# Altium schematic symbol library 6-Connectors 连接器.端子.SchLib: 402 symbols (part 5 of 5)
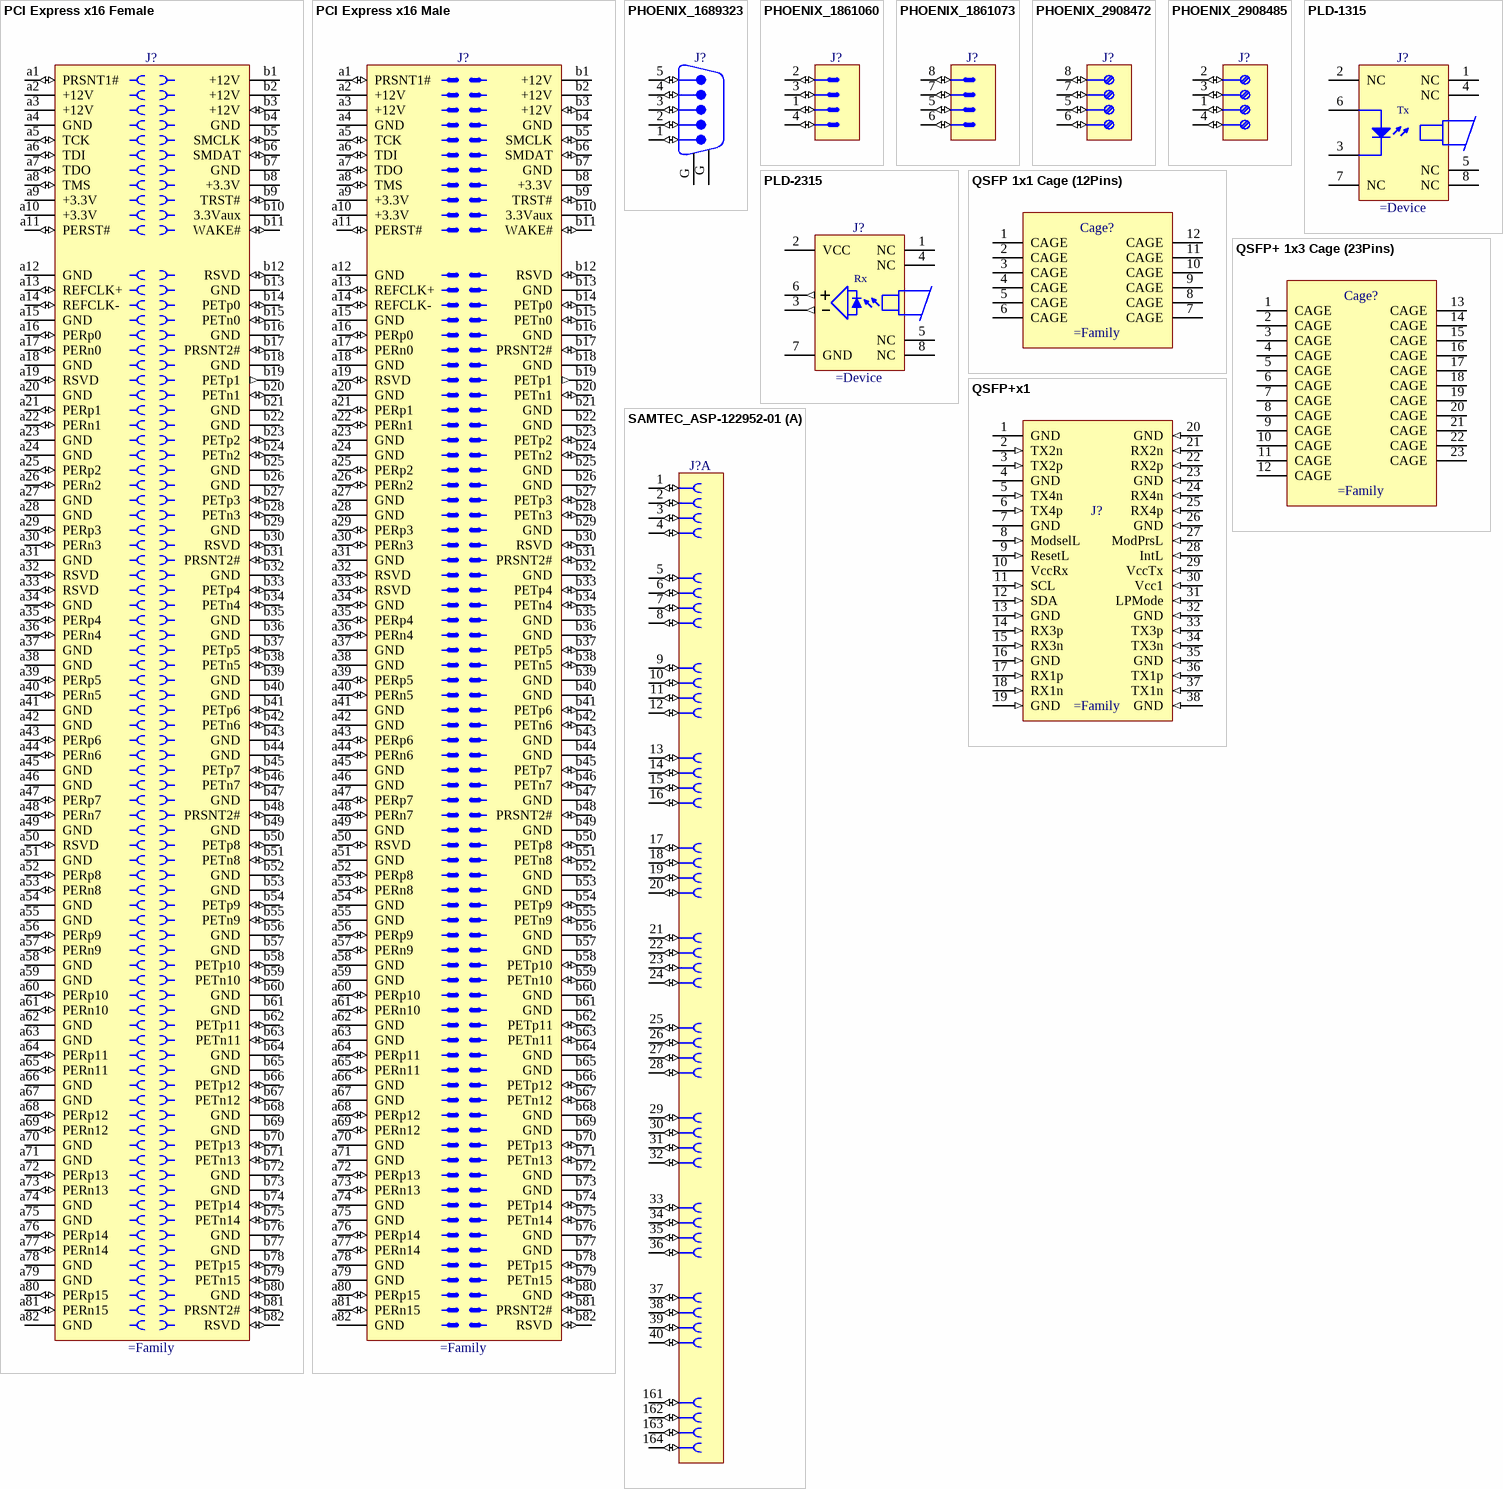
[diagram p53: symbols PCI Express x16 Female to SAMTEC_ASP-122952-01]

## PCI Express x16 Female
designator J?
164 contacts Board Eddge PCI Express x16 Connector
pins: a1 PRSNT1# (io), a2 +12V (power), a3 +12V (power), a4 GND (power), a5 TCK (io), a6 TDI (io), a7 TDO (io), a8 TMS (io), a9 +3.3V (power), a10 +3.3V (power), a11 PERST# (io), a12 GND (power), a13 REFCLK+ (io), a14 REFCLK- (io), a15 GND (power), a16 PERp0 (io), a17 PERn0 (io), a18 GND (power), a19 RSVD (io), a20 GND (power), a21 PERp1 (io), a22 PERn1 (io), a23 GND (power), a24 GND (power), a25 PERp2 (io), a26 PERn2 (io), a27 GND (power), a28 GND (power), a29 PERp3 (io), a30 PERn3 (io), a31 GND (power), a32 RSVD (io), a33 RSVD (io), a34 GND (io), a35 PERp4 (io), a36 PERn4 (io), a37 GND (power), a38 GND (power), a39 PERp5 (io), a40 PERn5 (io), a41 GND (power), a42 GND (power), a43 PERp6 (io), a44 PERn6 (io), a45 GND (power), a46 GND (power), a47 PERp7 (io), a48 PERn7 (io), a49 GND (power), a50 RSVD (io), a51 GND (power), a52 PERp8 (io), a53 PERn8 (io), a54 GND (power), a55 GND (power), a56 PERp9 (io), a57 PERn9 (io), a58 GND (power), a59 GND (power), a60 PERp10 (io), a61 PERn10 (io), a62 GND (power), a63 GND (power), a64 PERp11 (io), a65 PERn11 (io), a66 GND (power), a67 GND (power), a68 PERp12 (io), a69 PERn12 (io), a70 GND (power), a71 GND (power), a72 PERp13 (io), a73 PERn13 (io), a74 GND (power), a75 GND (power), a76 PERp14 (io), a77 PERn14 (io), a78 GND (power), a79 GND (power), a80 PERp15 (io), a81 PERn15 (io), a82 GND (power), b1 +12V (power), b2 +12V (power), b3 +12V (io), b4 GND (power), b5 SMCLK (io), b6 SMDAT (io), b7 GND (power), b8 +3.3V (power), b9 TRST# (io), b10 3.3Vaux (power), b11 WAKE# (io), b12 RSVD (io), b13 GND (power), b14 PETp0 (io), b15 PETn0 (io), b16 GND (power), b17 PRSNT2# (io), b18 GND (power), b19 PETp1 (out), b20 PETn1 (io), b21 GND (power), b22 GND (power), b23 PETp2 (io), b24 PETn2 (io), b25 GND (power), b26 GND (power), b27 PETp3 (io), b28 PETn3 (io), b29 GND (power), b30 RSVD (io), b31 PRSNT2# (io), b32 GND (power), b33 PETp4 (io), b34 PETn4 (io), b35 GND (power), b36 GND (power), b37 PETp5 (io), b38 PETn5 (io), b39 GND (power), b40 GND (power), b41 PETp6 (io), b42 PETn6 (io), b43 GND (power), b44 GND (power), b45 PETp7 (io), b46 PETn7 (io), b47 GND (power), b48 PRSNT2# (io), b49 GND (power), b50 PETp8 (io), b51 PETn8 (io), b52 GND (power), b53 GND (power), b54 PETp9 (io), b55 PETn9 (io), b56 GND (power), b57 GND (power), b58 PETp10 (io), b59 PETn10 (io), b60 GND (power), b61 GND (power), b62 PETp11 (io), b63 PETn11 (io), b64 GND (power), b65 GND (power), b66 PETp12 (io), b67 PETn12 (io), b68 GND (power), b69 GND (power), b70 PETp13 (io), b71 PETn13 (io), b72 GND (power), b73 GND (power), b74 PETp14 (io), b75 PETn14 (io), b76 GND (power), b77 GND (power), b78 PETp15 (io), b79 PETn15 (io), b80 GND (io), b81 PRSNT2# (io), b82 RSVD (io)

## PCI Express x16 Male
designator J?
164 contacts Board Eddge PCI Express x16 Connector
pins: a1 PRSNT1# (io), a2 +12V (power), a3 +12V (power), a4 GND (power), a5 TCK (io), a6 TDI (io), a7 TDO (io), a8 TMS (io), a9 +3.3V (power), a10 +3.3V (power), a11 PERST# (io), a12 GND (power), a13 REFCLK+ (io), a14 REFCLK- (io), a15 GND (power), a16 PERp0 (io), a17 PERn0 (io), a18 GND (power), a19 RSVD (io), a20 GND (power), a21 PERp1 (io), a22 PERn1 (io), a23 GND (power), a24 GND (power), a25 PERp2 (io), a26 PERn2 (io), a27 GND (power), a28 GND (power), a29 PERp3 (io), a30 PERn3 (io), a31 GND (power), a32 RSVD (io), a33 RSVD (io), a34 GND (io), a35 PERp4 (io), a36 PERn4 (io), a37 GND (power), a38 GND (power), a39 PERp5 (io), a40 PERn5 (io), a41 GND (power), a42 GND (power), a43 PERp6 (io), a44 PERn6 (io), a45 GND (power), a46 GND (power), a47 PERp7 (io), a48 PERn7 (io), a49 GND (power), a50 RSVD (io), a51 GND (power), a52 PERp8 (io), a53 PERn8 (io), a54 GND (power), a55 GND (power), a56 PERp9 (io), a57 PERn9 (io), a58 GND (power), a59 GND (power), a60 PERp10 (io), a61 PERn10 (io), a62 GND (power), a63 GND (power), a64 PERp11 (io), a65 PERn11 (io), a66 GND (power), a67 GND (power), a68 PERp12 (io), a69 PERn12 (io), a70 GND (power), a71 GND (power), a72 PERp13 (io), a73 PERn13 (io), a74 GND (power), a75 GND (power), a76 PERp14 (io), a77 PERn14 (io), a78 GND (power), a79 GND (power), a80 PERp15 (io), a81 PERn15 (io), a82 GND (power), b1 +12V (power), b2 +12V (power), b3 +12V (io), b4 GND (power), b5 SMCLK (io), b6 SMDAT (io), b7 GND (power), b8 +3.3V (power), b9 TRST# (io), b10 3.3Vaux (power), b11 WAKE# (io), b12 RSVD (io), b13 GND (power), b14 PETp0 (io), b15 PETn0 (io), b16 GND (power), b17 PRSNT2# (io), b18 GND (power), b19 PETp1 (out), b20 PETn1 (io), b21 GND (power), b22 GND (power), b23 PETp2 (io), b24 PETn2 (io), b25 GND (power), b26 GND (power), b27 PETp3 (io), b28 PETn3 (io), b29 GND (power), b30 RSVD (io), b31 PRSNT2# (io), b32 GND (power), b33 PETp4 (io), b34 PETn4 (io), b35 GND (power), b36 GND (power), b37 PETp5 (io), b38 PETn5 (io), b39 GND (power), b40 GND (power), b41 PETp6 (io), b42 PETn6 (io), b43 GND (power), b44 GND (power), b45 PETp7 (io), b46 PETn7 (io), b47 GND (power), b48 PRSNT2# (io), b49 GND (power), b50 PETp8 (io), b51 PETn8 (io), b52 GND (power), b53 GND (power), b54 PETp9 (io), b55 PETn9 (io), b56 GND (power), b57 GND (power), b58 PETp10 (io), b59 PETn10 (io), b60 GND (power), b61 GND (power), b62 PETp11 (io), b63 PETn11 (io), b64 GND (power), b65 GND (power), b66 PETp12 (io), b67 PETn12 (io), b68 GND (power), b69 GND (power), b70 PETp13 (io), b71 PETn13 (io), b72 GND (power), b73 GND (power), b74 PETp14 (io), b75 PETn14 (io), b76 GND (power), b77 GND (power), b78 PETp15 (io), b79 PETn15 (io), b80 GND (io), b81 PRSNT2# (io), b82 RSVD (io)

## PHOENIX_1689323
designator J?
5-Positions POWER-SUBCON Shielded Header, With Capacitive  Ground Connection
pins: 1 (io), 2 (io), 3 (io), 4 (io), 5 (io), G, G

## PHOENIX_1861060
designator J?
COMBICON PCB Male Header, 4 Positions, Left
pins: 1 (io), 2 (io), 3 (io), 4 (io)
1 alternate drawing of the same symbol

## PHOENIX_1861073
designator J?
COMBICON PCB Male Header, 4 Positions, Right
pins: 5 (io), 6 (io), 7 (io), 8 (io)

## PHOENIX_2908472
designator J?
Terminal Block, 4 Positions, 5 to 8 With Screw Connection
pins: 5 (io), 6 (io), 7 (io), 8 (io)

## PHOENIX_2908485
designator J?
Terminal Block, 4 Positions, 1 to 4 With Screw Connection
pins: 1 (io), 2 (io), 3 (io), 4 (io)

## PLD-1315
designator J?
1300nm Singlemode Fiber Optic Transmitter
pins: 1 NC, 2 NC, 3 C (power), 4 NC, 5 NC, 6 A (power), 7 NC, 8 NC
text: Tx

## PLD-2315
designator J?
150Mbps, 1310 nm Fiber Optic Receiver
pins: 1 NC, 2 VCC (power), 3 SIG- (out), 4 NC, 5 NC, 6 SIG+ (out), 7 GND (power), 8 NC
text: Rx

## QSFP 1x1 Cage (12Pins)
designator Cage?
QSFP 1x1 Cage (12Pins)
pins: 1 CAGE (power), 2 CAGE (power), 3 CAGE (power), 4 CAGE (power), 5 CAGE (power), 6 CAGE (power), 7 CAGE (power), 8 CAGE (power), 9 CAGE (power), 10 CAGE (power), 11 CAGE (power), 12 CAGE (power)

## QSFP+ 1x3 Cage (23Pins)
designator Cage?
QSFP+ 1x3 Cage (23Pins)
pins: 1 CAGE (power), 2 CAGE (power), 3 CAGE (power), 4 CAGE (power), 5 CAGE (power), 6 CAGE (power), 7 CAGE (power), 8 CAGE (power), 9 CAGE (power), 10 CAGE (power), 11 CAGE (power), 12 CAGE (power), 13 CAGE (power), 14 CAGE (power), 15 CAGE (power), 16 CAGE (power), 17 CAGE (power), 18 CAGE (power), 19 CAGE (power), 20 CAGE (power), 21 CAGE (power), 22 CAGE (power), 23 CAGE (power)

## QSFP+x1
designator J?
38Position QSFP Connector  (Quad Small Form-factor Pluggable)
pins: 1 GND (power), 2 TX2n (in), 3 TX2p (in), 4 GND (power), 5 TX4n (in), 6 TX4p (in), 7 GND (power), 8 ModselL (in), 9 ResetL (in), 10 VccRx (power), 11 SCL (in), 12 SDA (in), 13 GND (in), 14 RX3p (in), 15 RX3n (in), 16 GND (in), 17 RX1p (in), 18 RX1n (in), 19 GND (in), 20 GND (in), 21 RX2n (in), 22 RX2p (in), 23 GND (in), 24 RX4n (in), 25 RX4p (in), 26 GND (in), 27 ModPrsL (in), 28 IntL (in), 29 VccTx (in), 30 Vcc1 (in), 31 LPMode (in), 32 GND (in), 33 TX3p (in), 34 TX3n (in), 35 GND (in), 36 TX1p (in), 37 TX1n (in), 38 GND (in)

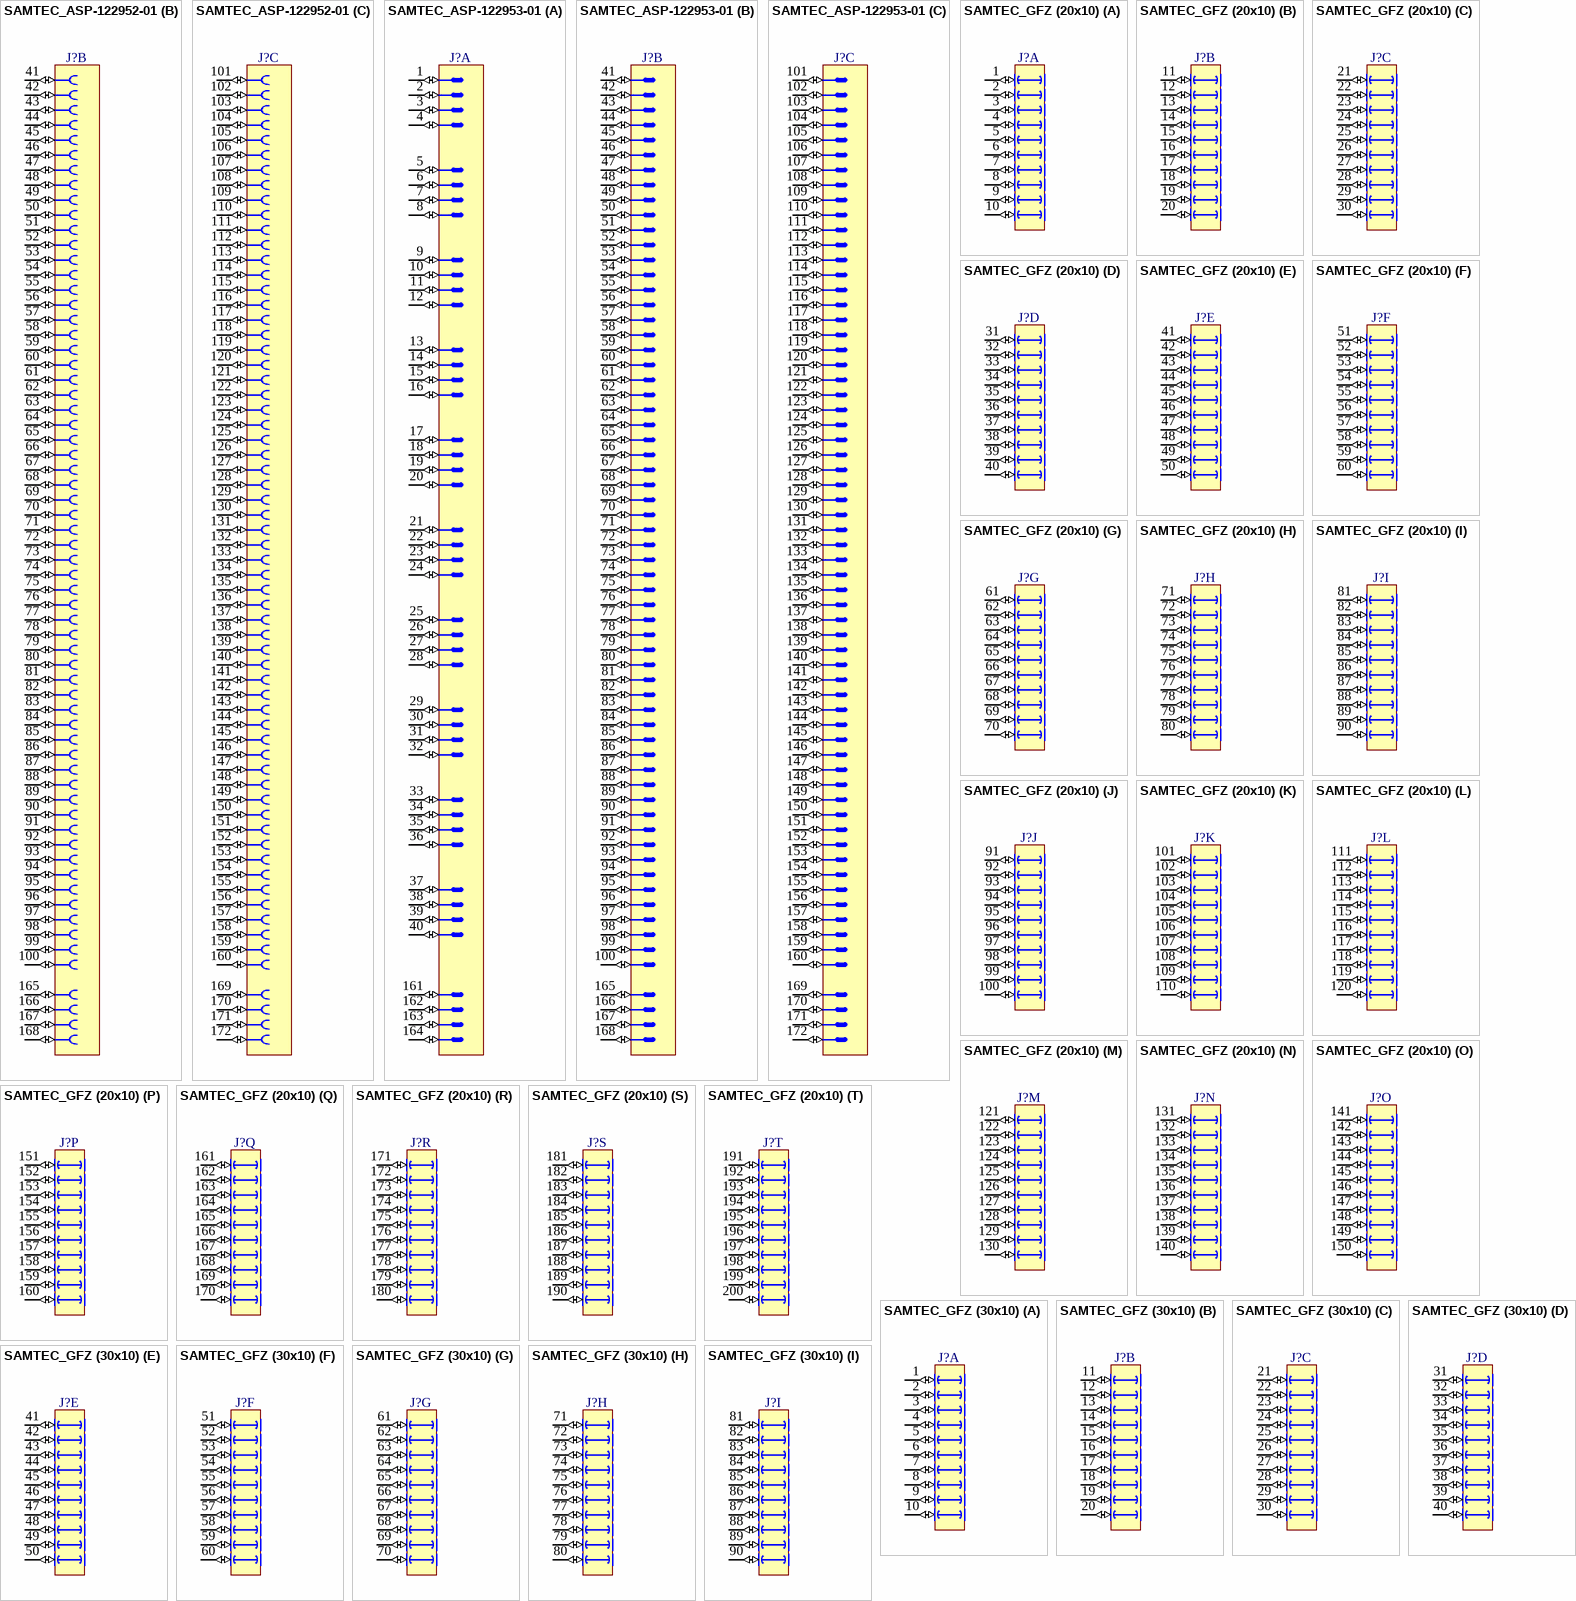
[diagram p43: symbols SAMTEC_ASP-122952-01 to SAMTEC_GFZ (30x10)]

## SAMTEC_ASP-122952-01
designator J?
Connector 160 Female 1x40 + 2x60 + 3x4 GND
part A pins: 1 (io), 2 (io), 3 (io), 4 (io), 5 (io), 6 (io), 7 (io), 8 (io), 9 (io), 10 (io), 11 (io), 12 (io), 13 (io), 14 (io), 15 (io), 16 (io), 17 (io), 18 (io), 19 (io), 20 (io), 21 (io), 22 (io), 23 (io), 24 (io), 25 (io), 26 (io), 27 (io), 28 (io), 29 (io), 30 (io), 31 (io), 32 (io), 33 (io), 34 (io), 35 (io), 36 (io), 37 (io), 38 (io), 39 (io), 40 (io), 161 (io), 162 (io), 163 (io), 164 (io)
part B pins: 41 (io), 42 (io), 43 (io), 44 (io), 45 (io), 46 (io), 47 (io), 48 (io), 49 (io), 50 (io), 51 (io), 52 (io), 53 (io), 54 (io), 55 (io), 56 (io), 57 (io), 58 (io), 59 (io), 60 (io), 61 (io), 62 (io), 63 (io), 64 (io), 65 (io), 66 (io), 67 (io), 68 (io), 69 (io), 70 (io), 71 (io), 72 (io), 73 (io), 74 (io), 75 (io), 76 (io), 77 (io), 78 (io), 79 (io), 80 (io), 81 (io), 82 (io), 83 (io), 84 (io), 85 (io), 86 (io), 87 (io), 88 (io), 89 (io), 90 (io), 91 (io), 92 (io), 93 (io), 94 (io), 95 (io), 96 (io), 97 (io), 98 (io), 99 (io), 100 (io), 165 (io), 166 (io), 167 (io), 168 (io)
part C pins: 101 (io), 102 (io), 103 (io), 104 (io), 105 (io), 106 (io), 107 (io), 108 (io), 109 (io), 110 (io), 111 (io), 112 (io), 113 (io), 114 (io), 115 (io), 116 (io), 117 (io), 118 (io), 119 (io), 120 (io), 121 (io), 122 (io), 123 (io), 124 (io), 125 (io), 126 (io), 127 (io), 128 (io), 129 (io), 130 (io), 131 (io), 132 (io), 133 (io), 134 (io), 135 (io), 136 (io), 137 (io), 138 (io), 139 (io), 140 (io), 141 (io), 142 (io), 143 (io), 144 (io), 145 (io), 146 (io), 147 (io), 148 (io), 149 (io), 150 (io), 151 (io), 152 (io), 153 (io), 154 (io), 155 (io), 156 (io), 157 (io), 158 (io), 159 (io), 160 (io), 169 (io), 170 (io), 171 (io), 172 (io)

## SAMTEC_ASP-122953-01
designator J?
Connector 160 Male 1x40 + 2x60 + 3x4 GND
part A pins: 1 (io), 2 (io), 3 (io), 4 (io), 5 (io), 6 (io), 7 (io), 8 (io), 9 (io), 10 (io), 11 (io), 12 (io), 13 (io), 14 (io), 15 (io), 16 (io), 17 (io), 18 (io), 19 (io), 20 (io), 21 (io), 22 (io), 23 (io), 24 (io), 25 (io), 26 (io), 27 (io), 28 (io), 29 (io), 30 (io), 31 (io), 32 (io), 33 (io), 34 (io), 35 (io), 36 (io), 37 (io), 38 (io), 39 (io), 40 (io), 161 (io), 162 (io), 163 (io), 164 (io)
part B pins: 41 (io), 42 (io), 43 (io), 44 (io), 45 (io), 46 (io), 47 (io), 48 (io), 49 (io), 50 (io), 51 (io), 52 (io), 53 (io), 54 (io), 55 (io), 56 (io), 57 (io), 58 (io), 59 (io), 60 (io), 61 (io), 62 (io), 63 (io), 64 (io), 65 (io), 66 (io), 67 (io), 68 (io), 69 (io), 70 (io), 71 (io), 72 (io), 73 (io), 74 (io), 75 (io), 76 (io), 77 (io), 78 (io), 79 (io), 80 (io), 81 (io), 82 (io), 83 (io), 84 (io), 85 (io), 86 (io), 87 (io), 88 (io), 89 (io), 90 (io), 91 (io), 92 (io), 93 (io), 94 (io), 95 (io), 96 (io), 97 (io), 98 (io), 99 (io), 100 (io), 165 (io), 166 (io), 167 (io), 168 (io)
part C pins: 101 (io), 102 (io), 103 (io), 104 (io), 105 (io), 106 (io), 107 (io), 108 (io), 109 (io), 110 (io), 111 (io), 112 (io), 113 (io), 114 (io), 115 (io), 116 (io), 117 (io), 118 (io), 119 (io), 120 (io), 121 (io), 122 (io), 123 (io), 124 (io), 125 (io), 126 (io), 127 (io), 128 (io), 129 (io), 130 (io), 131 (io), 132 (io), 133 (io), 134 (io), 135 (io), 136 (io), 137 (io), 138 (io), 139 (io), 140 (io), 141 (io), 142 (io), 143 (io), 144 (io), 145 (io), 146 (io), 147 (io), 148 (io), 149 (io), 150 (io), 151 (io), 152 (io), 153 (io), 154 (io), 155 (io), 156 (io), 157 (io), 158 (io), 159 (io), 160 (io), 169 (io), 170 (io), 171 (io), 172 (io)

## SAMTEC_GFZ (20x10)
designator J?
Connector 200 (10X20)
part A pins: 1 (io), 2 (io), 3 (io), 4 (io), 5 (io), 6 (io), 7 (io), 8 (io), 9 (io), 10 (io)
part B pins: 11 (io), 12 (io), 13 (io), 14 (io), 15 (io), 16 (io), 17 (io), 18 (io), 19 (io), 20 (io)
part C pins: 21 (io), 22 (io), 23 (io), 24 (io), 25 (io), 26 (io), 27 (io), 28 (io), 29 (io), 30 (io)
part D pins: 31 (io), 32 (io), 33 (io), 34 (io), 35 (io), 36 (io), 37 (io), 38 (io), 39 (io), 40 (io)
part E pins: 41 (io), 42 (io), 43 (io), 44 (io), 45 (io), 46 (io), 47 (io), 48 (io), 49 (io), 50 (io)
part F pins: 51 (io), 52 (io), 53 (io), 54 (io), 55 (io), 56 (io), 57 (io), 58 (io), 59 (io), 60 (io)
part G pins: 61 (io), 62 (io), 63 (io), 64 (io), 65 (io), 66 (io), 67 (io), 68 (io), 69 (io), 70 (io)
part H pins: 71 (io), 72 (io), 73 (io), 74 (io), 75 (io), 76 (io), 77 (io), 78 (io), 79 (io), 80 (io)
part I pins: 81 (io), 82 (io), 83 (io), 84 (io), 85 (io), 86 (io), 87 (io), 88 (io), 89 (io), 90 (io)
part J pins: 91 (io), 92 (io), 93 (io), 94 (io), 95 (io), 96 (io), 97 (io), 98 (io), 99 (io), 100 (io)
part K pins: 101 (io), 102 (io), 103 (io), 104 (io), 105 (io), 106 (io), 107 (io), 108 (io), 109 (io), 110 (io)
part L pins: 111 (io), 112 (io), 113 (io), 114 (io), 115 (io), 116 (io), 117 (io), 118 (io), 119 (io), 120 (io)
part M pins: 121 (io), 122 (io), 123 (io), 124 (io), 125 (io), 126 (io), 127 (io), 128 (io), 129 (io), 130 (io)
part N pins: 131 (io), 132 (io), 133 (io), 134 (io), 135 (io), 136 (io), 137 (io), 138 (io), 139 (io), 140 (io)
part O pins: 141 (io), 142 (io), 143 (io), 144 (io), 145 (io), 146 (io), 147 (io), 148 (io), 149 (io), 150 (io)
part P pins: 151 (io), 152 (io), 153 (io), 154 (io), 155 (io), 156 (io), 157 (io), 158 (io), 159 (io), 160 (io)
part Q pins: 161 (io), 162 (io), 163 (io), 164 (io), 165 (io), 166 (io), 167 (io), 168 (io), 169 (io), 170 (io)
part R pins: 171 (io), 172 (io), 173 (io), 174 (io), 175 (io), 176 (io), 177 (io), 178 (io), 179 (io), 180 (io)
part S pins: 181 (io), 182 (io), 183 (io), 184 (io), 185 (io), 186 (io), 187 (io), 188 (io), 189 (io), 190 (io)
part T pins: 191 (io), 192 (io), 193 (io), 194 (io), 195 (io), 196 (io), 197 (io), 198 (io), 199 (io), 200 (io)
1 alternate drawing of the same symbol

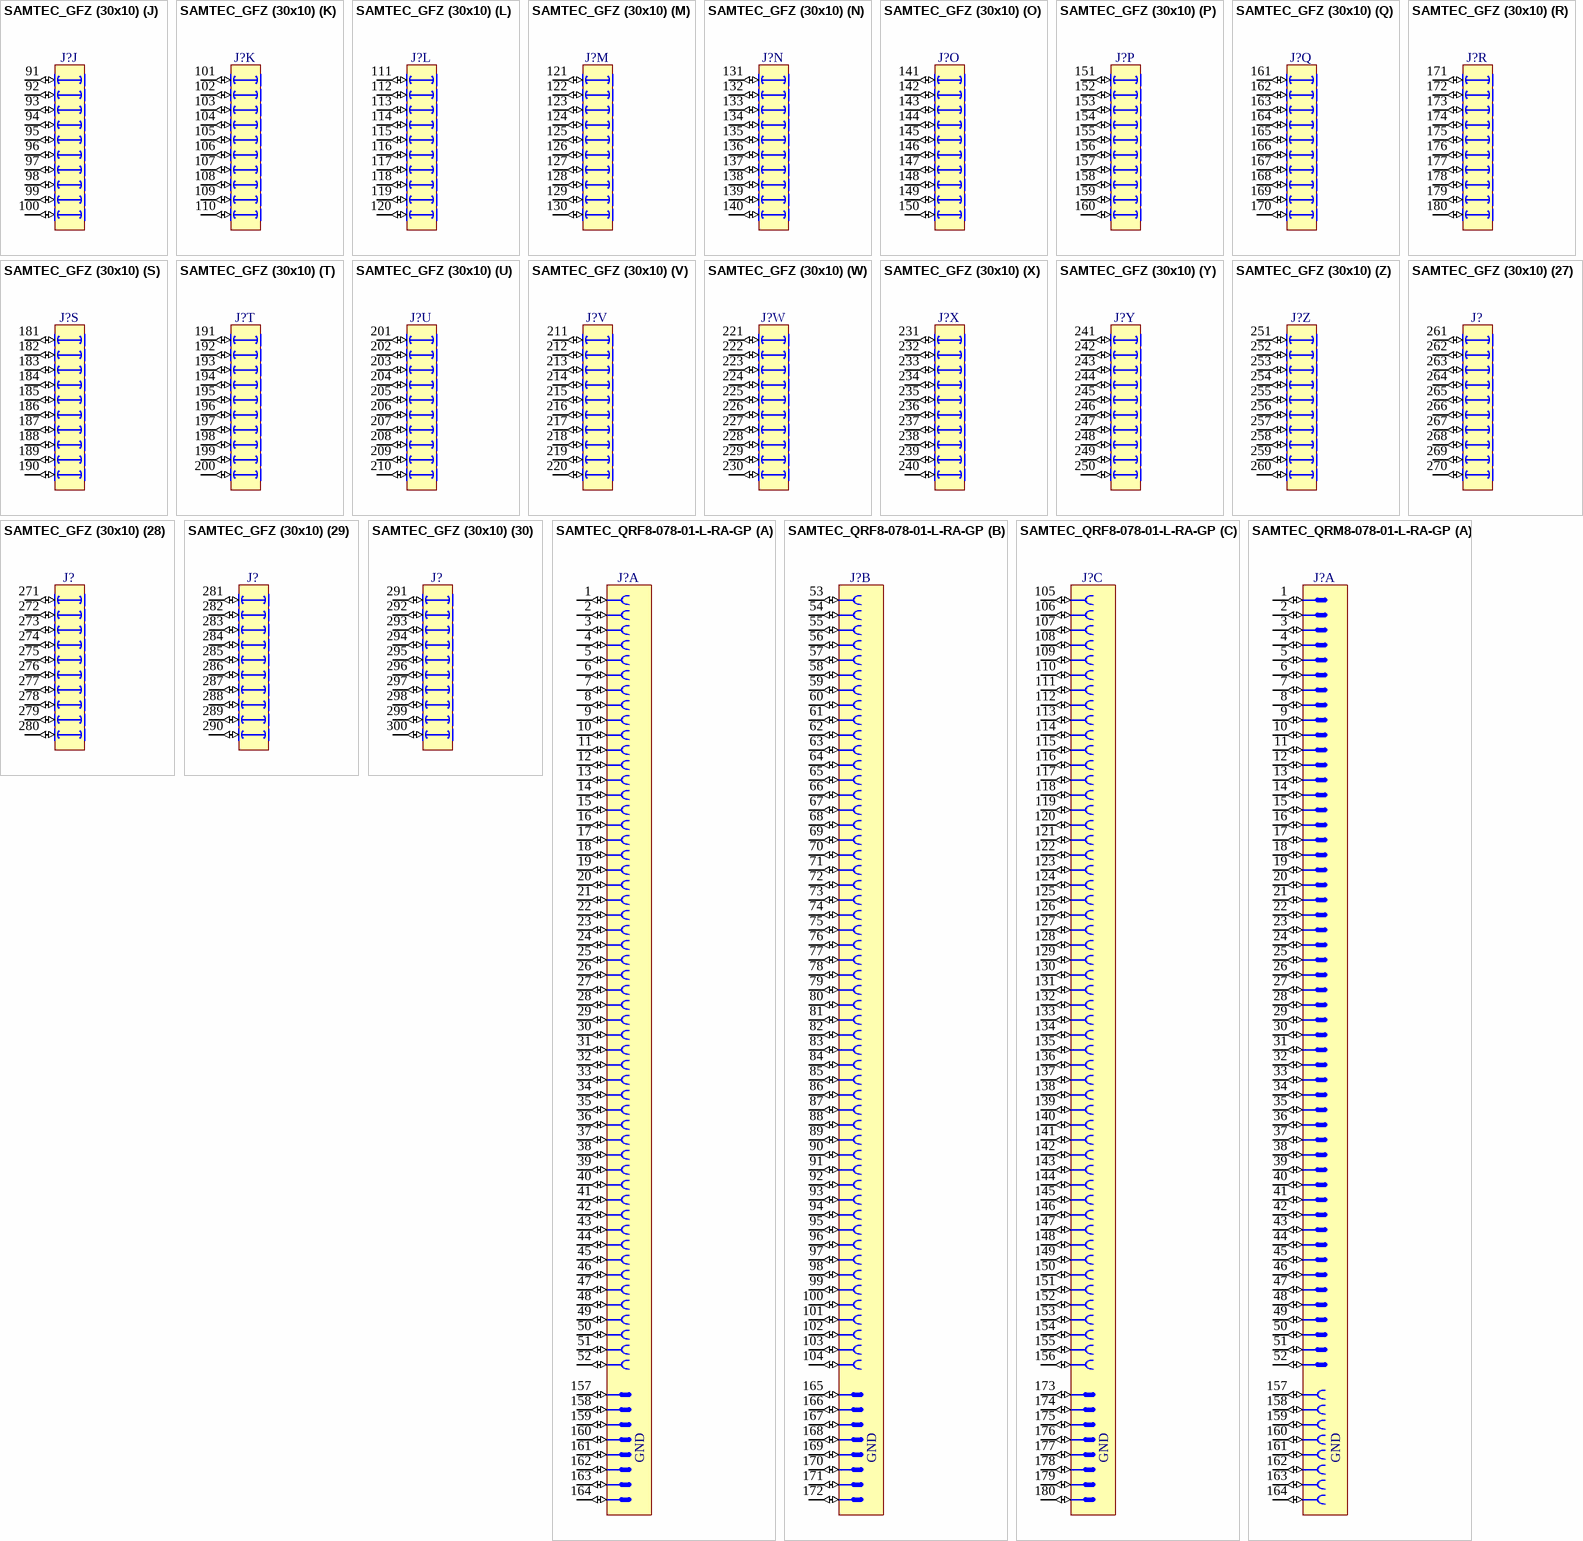
[diagram p44: symbols SAMTEC_GFZ (30x10) to SAMTEC_QRM8-078-01-L-RA-GP]

## SAMTEC_GFZ (30x10)
designator J?
Connector 300 (10X30)
part A pins: 1 (io), 2 (io), 3 (io), 4 (io), 5 (io), 6 (io), 7 (io), 8 (io), 9 (io), 10 (io)
part B pins: 11 (io), 12 (io), 13 (io), 14 (io), 15 (io), 16 (io), 17 (io), 18 (io), 19 (io), 20 (io)
part C pins: 21 (io), 22 (io), 23 (io), 24 (io), 25 (io), 26 (io), 27 (io), 28 (io), 29 (io), 30 (io)
part D pins: 31 (io), 32 (io), 33 (io), 34 (io), 35 (io), 36 (io), 37 (io), 38 (io), 39 (io), 40 (io)
part E pins: 41 (io), 42 (io), 43 (io), 44 (io), 45 (io), 46 (io), 47 (io), 48 (io), 49 (io), 50 (io)
part F pins: 51 (io), 52 (io), 53 (io), 54 (io), 55 (io), 56 (io), 57 (io), 58 (io), 59 (io), 60 (io)
part G pins: 61 (io), 62 (io), 63 (io), 64 (io), 65 (io), 66 (io), 67 (io), 68 (io), 69 (io), 70 (io)
part H pins: 71 (io), 72 (io), 73 (io), 74 (io), 75 (io), 76 (io), 77 (io), 78 (io), 79 (io), 80 (io)
part I pins: 81 (io), 82 (io), 83 (io), 84 (io), 85 (io), 86 (io), 87 (io), 88 (io), 89 (io), 90 (io)
part J pins: 91 (io), 92 (io), 93 (io), 94 (io), 95 (io), 96 (io), 97 (io), 98 (io), 99 (io), 100 (io)
part K pins: 101 (io), 102 (io), 103 (io), 104 (io), 105 (io), 106 (io), 107 (io), 108 (io), 109 (io), 110 (io)
part L pins: 111 (io), 112 (io), 113 (io), 114 (io), 115 (io), 116 (io), 117 (io), 118 (io), 119 (io), 120 (io)
part M pins: 121 (io), 122 (io), 123 (io), 124 (io), 125 (io), 126 (io), 127 (io), 128 (io), 129 (io), 130 (io)
part N pins: 131 (io), 132 (io), 133 (io), 134 (io), 135 (io), 136 (io), 137 (io), 138 (io), 139 (io), 140 (io)
part O pins: 141 (io), 142 (io), 143 (io), 144 (io), 145 (io), 146 (io), 147 (io), 148 (io), 149 (io), 150 (io)
part P pins: 151 (io), 152 (io), 153 (io), 154 (io), 155 (io), 156 (io), 157 (io), 158 (io), 159 (io), 160 (io)
part Q pins: 161 (io), 162 (io), 163 (io), 164 (io), 165 (io), 166 (io), 167 (io), 168 (io), 169 (io), 170 (io)
part R pins: 171 (io), 172 (io), 173 (io), 174 (io), 175 (io), 176 (io), 177 (io), 178 (io), 179 (io), 180 (io)
part S pins: 181 (io), 182 (io), 183 (io), 184 (io), 185 (io), 186 (io), 187 (io), 188 (io), 189 (io), 190 (io)
part T pins: 191 (io), 192 (io), 193 (io), 194 (io), 195 (io), 196 (io), 197 (io), 198 (io), 199 (io), 200 (io)
part U pins: 201 (io), 202 (io), 203 (io), 204 (io), 205 (io), 206 (io), 207 (io), 208 (io), 209 (io), 210 (io)
part V pins: 211 (io), 212 (io), 213 (io), 214 (io), 215 (io), 216 (io), 217 (io), 218 (io), 219 (io), 220 (io)
part W pins: 221 (io), 222 (io), 223 (io), 224 (io), 225 (io), 226 (io), 227 (io), 228 (io), 229 (io), 230 (io)
part X pins: 231 (io), 232 (io), 233 (io), 234 (io), 235 (io), 236 (io), 237 (io), 238 (io), 239 (io), 240 (io)
part Y pins: 241 (io), 242 (io), 243 (io), 244 (io), 245 (io), 246 (io), 247 (io), 248 (io), 249 (io), 250 (io)
part Z pins: 251 (io), 252 (io), 253 (io), 254 (io), 255 (io), 256 (io), 257 (io), 258 (io), 259 (io), 260 (io)
part 27 pins: 261 (io), 262 (io), 263 (io), 264 (io), 265 (io), 266 (io), 267 (io), 268 (io), 269 (io), 270 (io)
part 28 pins: 271 (io), 272 (io), 273 (io), 274 (io), 275 (io), 276 (io), 277 (io), 278 (io), 279 (io), 280 (io)
part 29 pins: 281 (io), 282 (io), 283 (io), 284 (io), 285 (io), 286 (io), 287 (io), 288 (io), 289 (io), 290 (io)
part 30 pins: 291 (io), 292 (io), 293 (io), 294 (io), 295 (io), 296 (io), 297 (io), 298 (io), 299 (io), 300 (io)
1 alternate drawing of the same symbol

## SAMTEC_QRF8-078-01-L-RA-GP
designator J?
156 Contacts (3x52), Pitch 0.8mm, Right Angle Ground Plane Socket, QRF8-RA Serie
part A pins: 1 (io), 2 (io), 3 (io), 4 (io), 5 (io), 6 (io), 7 (io), 8 (io), 9 (io), 10 (io), 11 (io), 12 (io), 13 (io), 14 (io), 15 (io), 16 (io), 17 (io), 18 (io), 19 (io), 20 (io), 21 (io), 22 (io), 23 (io), 24 (io), 25 (io), 26 (io), 27 (io), 28 (io), 29 (io), 30 (io), 31 (io), 32 (io), 33 (io), 34 (io), 35 (io), 36 (io), 37 (io), 38 (io), 39 (io), 40 (io), 41 (io), 42 (io), 43 (io), 44 (io), 45 (io), 46 (io), 47 (io), 48 (io), 49 (io), 50 (io), 51 (io), 52 (io), 157 GND (io), 158 GND (io), 159 GND (io), 160 GND (io), 161 GND (io), 162 GND (io), 163 GND (io), 164 GND (io)
part B pins: 53 (io), 54 (io), 55 (io), 56 (io), 57 (io), 58 (io), 59 (io), 60 (io), 61 (io), 62 (io), 63 (io), 64 (io), 65 (io), 66 (io), 67 (io), 68 (io), 69 (io), 70 (io), 71 (io), 72 (io), 73 (io), 74 (io), 75 (io), 76 (io), 77 (io), 78 (io), 79 (io), 80 (io), 81 (io), 82 (io), 83 (io), 84 (io), 85 (io), 86 (io), 87 (io), 88 (io), 89 (io), 90 (io), 91 (io), 92 (io), 93 (io), 94 (io), 95 (io), 96 (io), 97 (io), 98 (io), 99 (io), 100 (io), 101 (io), 102 (io), 103 (io), 104 (io), 165 GND (io), 166 GND (io), 167 GND (io), 168 GND (io), 169 GND (io), 170 GND (io), 171 GND (io), 172 GND (io)
part C pins: 105 (io), 106 (io), 107 (io), 108 (io), 109 (io), 110 (io), 111 (io), 112 (io), 113 (io), 114 (io), 115 (io), 116 (io), 117 (io), 118 (io), 119 (io), 120 (io), 121 (io), 122 (io), 123 (io), 124 (io), 125 (io), 126 (io), 127 (io), 128 (io), 129 (io), 130 (io), 131 (io), 132 (io), 133 (io), 134 (io), 135 (io), 136 (io), 137 (io), 138 (io), 139 (io), 140 (io), 141 (io), 142 (io), 143 (io), 144 (io), 145 (io), 146 (io), 147 (io), 148 (io), 149 (io), 150 (io), 151 (io), 152 (io), 153 (io), 154 (io), 155 (io), 156 (io), 173 GND (io), 174 GND (io), 175 GND (io), 176 GND (io), 177 GND (io), 178 GND (io), 179 GND (io), 180 GND (io)
